# Altium footprint library ACTION_Connector.PcbLib: 138 footprints (part 8 of 9)
Each footprint in its own frame and in the unit in brackets; x right, y up, seen from the top. Pads: shape width x height; smd on the part's side, far side on the other; paste and mask are expansions set on the pad; w line width, h text height; cw(c..) or ccw(c..) is an arc to the next point about the centre after c.
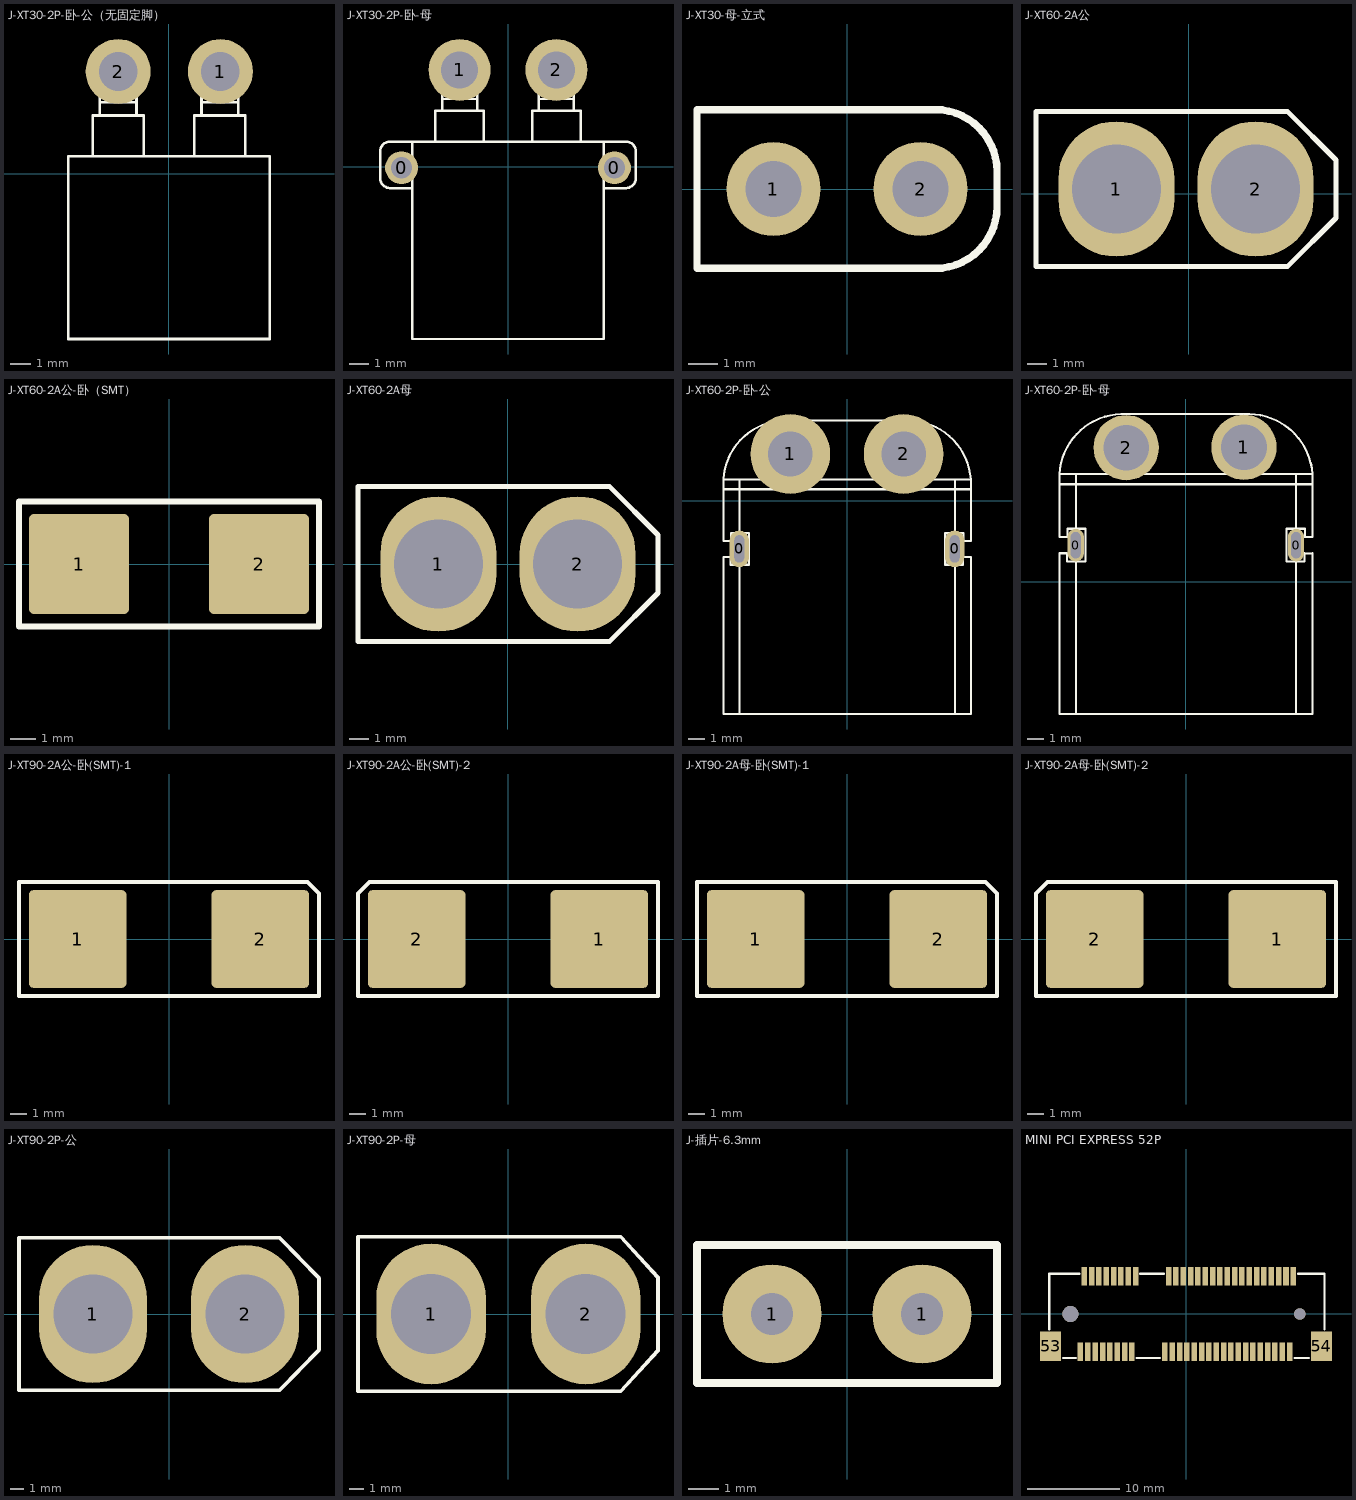
[diagram p7: the footprints below, top view; thin cyan lines are the x and y axes]

## J-XT30-2P-卧-公（无固定脚） [mm]
pads (2):
  round 3.2 hole 1.9: 1(2.54,5.042) 2(-2.489,5.042)
Top Overlay:
  circle w0.127: c2.513,4.937 r0.5
  circle w0.127: c2.513,4.937 r0.8
  circle w0.127: c-2.487,4.937 r0.5
  circle w0.127: c-2.487,4.937 r0.8
  lines w0.127: -3.738,0.877 -3.738,2.877 -1.238,2.877 -1.238,0.877 ; -3.388,2.877 -3.388,3.527 ; -1.588,2.877 -1.588,3.527 ; 1.262,0.877 1.262,2.877 3.762,2.877 3.762,0.877 ; 1.612,4.927 cw(c2.512,4.927) 3.412,4.927 3.412,3.527 ; 1.612,2.877 1.612,3.527 ; 1.612,4.927 1.612,3.527 ; 3.412,2.877 3.412,3.527 ; -3.388,3.527 -1.588,3.527 ; -3.388,3.527 -3.388,4.927 cw(c-2.488,4.927) -1.588,4.927 -1.588,3.527 ; 1.612,3.527 3.412,3.527 ; -4.938,-8.123 -4.938,0.877 -4.038,0.877 4.062,0.877 4.962,0.877 4.962,-8.123 4.062,-8.123 -4.038,-8.123 -4.938,-8.123
3D body "XT30PW-M 3D DRAWING 214.STEP": height 5.35, standoff -1.85, extent -6.645,-8.169 6.655,5.781

## J-XT30-2P-卧-母 [mm]
pads (4):
  round 1.7 hole 1.1: 0(-5.5,-0.05) 0(5.5,-0.05)
  round 3.2 hole 1.9: 1(-2.5,5) 2(2.5,5)
Top Overlay:
  circle w0.127: c-5.513,-0.05 r0.55
  circle w0.127: c5.487,-0.05 r0.5
  circle w0.127: c2.488,4.937 r0.5
  circle w0.127: c2.488,4.937 r0.8
  circle w0.127: c-2.512,4.937 r0.5
  circle w0.127: c-2.512,4.937 r0.8
  lines w0.127: -4.95,-1.1 -6.1,-1.1 cw(c-6.1,-0.6) -6.6,-0.6 -6.6,0.8 cw(c-6.1,0.8) -6.1,1.3 -4.95,1.3 ; -3.75,1.3 -3.75,2.9 -1.25,2.9 -1.25,1.3 ; -3.413,4.927 cw(c-2.513,4.927) -1.613,4.927 ; -3.4,2.9 -3.4,3.5 ; -3.4,4.9 -3.4,3.5 ; -1.6,2.9 -1.6,3.5 ; -1.6,4.9 -1.6,3.5 ; 1.25,1.3 1.25,2.9 3.75,2.9 3.75,1.3 ; 1.587,4.927 cw(c2.487,4.927) 3.387,4.927 ; 1.6,2.9 1.6,3.5 3.4,3.5 ; 1.6,3.527 1.6,4.927 ; 3.4,2.9 3.4,3.5 ; 3.4,4.9 3.4,3.5 ; 4.95,-1.1 6.1,-1.1 ccw(c6.1,-0.6) 6.6,-0.6 6.6,0.8 ccw(c6.1,0.8) 6.1,1.3 4.95,1.3 ; -4.95,1.3 4.95,1.3 ; -4.95,1.3 -4.95,-8.9 4.95,-8.9 4.95,1.3 ; -3.4,3.5 -1.6,3.5
3D body "User Library-XT30PW-F.STEP": height 5.1, standoff -1.9, extent -6.65,-8.937 6.65,5.963

## J-XT30-母-立式 [mm]
pads (2):
  round 3.2 hole 1.9: 1(-2.5,0) 2(2.5,0)
Top Overlay:
  lines w0.254: -5.1,-2.7 3,-2.7 ccw(c3,-0.6) 5.1,-0.6 5.1,0.6 ccw(c3,0.6) 3,2.7 -5.1,2.7 -5.1,-2.7
3D body: height 0.25, standoff 0, extent -10.897,7.569 -10.897,7.569
3D body: height 0.25, standoff 0, extent -0.559,3.785 -0.559,3.785
3D body "User Library-XT30UPB-F-1.STEP": height 9.4, standoff -2, extent -5.1,-2.6 5.1,2.6

## J-XT60-2A公 [mm]
pads (2):
  oval 6x7 hole 4.6: 1(-3.752,0.254) 2(3.448,0.254)
Top Overlay:
  lines w0.254: -7.902,4.253 -7.902,-3.759 5.105,-3.759 ; -7.902,4.267 5.105,4.267 5.105,4.246 7.598,1.754 ; 5.105,-3.738 7.598,-1.246 ; 7.598,-1.246 7.598,1.754 ; 7.598,-1.246 7.598,1.754
3D body "User Library-XT60UPB Fem Vert.STEP": height 13.64, standoff -1.96, extent -7.802,-3.823 7.54,4.077

## J-XT60-2A公-卧（SMT） [mm]
pads (2):
  rrect10% 4x4 smd: 1(-3.6,0) 2(3.6,0)
Top Overlay:
  lines w0.254: -6,-2.5 6,-2.5 6,2.5 -6,2.5 -6,-2.5
3D body "User Library-XT60UPB Fem Vert.STEP": height 6.15, standoff -1.75, extent -7.65,-16.338 7.692,-0.739

## J-XT60-2A母 [mm]
height 1.75
pads (2):
  oval 6x7 hole 4.6: 1(-3.6,0) 2(3.6,0)
Top Overlay:
  lines w0.254: -7.75,3.999 -7.75,-4.013 5.258,-4.013 ; -7.75,4.013 5.258,4.013 5.258,3.992 7.75,1.5 ; 5.258,-3.992 7.75,-1.5 ; 7.75,-1.5 7.75,1.5 ; 7.75,-1.5 7.75,1.5
3D body "M.step": height 15.1, standoff -1.9, extent -7.95,-4.089 7.95,3.911

## J-XT60-2P-卧-公 [mm]
pads (4):
  oval 1.2x2.3 hole 0.6 slot 1.7 at 90 deg: 0(-6.75,-2.999) 0(6.75,-2.999)
  round 5 hole 2.8: 1(-3.55,2.95) 2(3.55,2.95)
Top Overlay:
  circle w0.127: c-3.605,2.998 r0.961
  circle w0.127: c-3.605,2.998 r1.25
  circle w0.127: c3.595,2.998 r0.961
  circle w0.127: c3.595,2.998 r1.25
  lines w0.127: -7.252,-2.494 -7.252,-1.994 -6.745,-1.994 ; -7.095,0.706 -7.095,0.756 ; -7.055,-2.503 -7.745,-2.503 -7.745,0.706 ; -5.595,0.706 -5.595,0.756 ; 5.605,0.706 5.605,0.756 ; 7.045,-3.503 7.745,-3.503 ; 7.045,-3.498 7.252,-3.498 7.745,-3.498 ; 7.045,-2.503 7.745,-2.503 ; 7.045,-2.498 7.286,-2.498 7.745,-2.498 ; 7.105,0.706 7.105,0.756 ; 7.263,-3.494 7.263,-3.994 6.755,-3.994 ; 7.297,-2.494 7.297,-1.994 6.755,-1.994 ; 7.557,1.356 7.557,1.358 ; 7.755,-3.494 7.755,-13.344 6.755,-13.344 ; 7.755,-2.494 7.755,0.706 ; -7.745,0.706 -6.745,0.706 ; -7.745,0.706 -7.745,0.756 ; -7.745,0.756 -6.745,0.756 ; -7.745,0.756 -7.745,1.356 ; -7.745,1.356 cw(c-3.852,1.136) -3.632,5.029 3.556,5.029 cw(c3.819,1.093) 7.755,1.356 ; -7.745,1.356 -6.745,1.356 ; -6.745,-13.344 6.755,-13.344 ; -6.745,-13.344 -6.745,-3.994 ; -6.745,-13.344 -7.745,-13.344 -7.745,-3.494 -7.286,-3.494 -7.286,-3.994 -6.745,-3.994 ; -6.745,-3.994 -6.145,-3.994 -6.145,-1.994 -6.745,-1.994 ; -6.745,-1.994 -6.745,0.706 ; -6.745,0.706 6.755,0.706 ; -6.745,0.756 -6.745,1.356 ; -6.745,0.756 6.755,0.756 ; -6.745,1.356 6.755,1.356 ; 6.755,-13.344 6.755,-3.994 ; 6.755,-3.994 6.155,-3.994 6.155,-1.994 6.755,-1.994 ; 6.755,-1.994 6.755,0.706 ; 6.755,0.706 7.755,0.706 ; 6.755,0.756 6.755,1.356 ; 6.755,0.756 7.755,0.756 ; 6.755,1.356 7.755,1.356 ; 7.755,0.706 7.755,0.756 ; 7.755,0.756 7.755,1.356
3D body "XT60PW-M 3D DRAWING.STEP": height 8.7, standoff -1.8, extent -7.95,-13.366 7.95,4.934

## J-XT60-2P-卧-母 [mm]
pads (4):
  oval 1x2 hole 0.6 slot 1.6 at 90 deg: 0(-6.75,2.234) 0(6.75,2.234)
  round 4 hole 2.8: 1(3.556,8.231) 2(-3.658,8.206)
Top Overlay:
  circle w0.127: c3.595,8.23 r1.25
  circle w0.127: c3.595,8.23 r0.961
  circle w0.127: c-3.605,8.23 r1.25
  circle w0.127: c-3.605,8.23 r0.961
  lines w0.127: -7.252,2.738 -7.252,3.238 -6.745,3.238 ; -7.095,5.938 -7.095,5.988 ; -7.055,2.729 -7.745,2.729 -7.745,5.938 ; -5.595,5.938 -5.595,5.988 ; 5.605,5.938 5.605,5.988 ; 7.045,1.729 7.745,1.729 ; 7.045,1.735 7.252,1.735 7.745,1.735 ; 7.045,2.729 7.745,2.729 ; 7.045,2.735 7.286,2.735 7.745,2.735 ; 7.105,5.938 7.105,5.988 ; 7.263,1.738 7.263,1.238 6.755,1.238 ; 7.297,2.738 7.297,3.238 6.755,3.238 ; 7.557,6.589 7.557,6.59 ; 7.755,1.738 7.755,-8.112 6.755,-8.112 ; 7.755,2.738 7.755,5.938 ; -7.745,5.938 -7.745,5.988 ; -7.745,5.938 -6.745,5.938 ; -7.745,5.988 -7.745,6.588 ; -7.745,5.988 -6.745,5.988 ; -7.745,6.588 cw(c-3.852,6.369) -3.632,10.262 3.556,10.262 cw(c3.819,6.325) 7.755,6.588 ; -7.745,6.588 -6.745,6.588 ; -6.745,-8.112 -7.745,-8.112 -7.745,1.738 -7.286,1.738 -7.286,1.238 -6.745,1.238 ; -6.745,-8.112 -6.745,1.238 ; -6.745,-8.112 6.755,-8.112 ; -6.745,1.238 -6.145,1.238 -6.145,3.238 -6.745,3.238 ; -6.745,3.238 -6.745,5.938 ; -6.745,5.938 6.755,5.938 ; -6.745,5.988 6.755,5.988 ; -6.745,5.988 -6.745,6.588 ; -6.745,6.588 6.755,6.588 ; 6.755,-8.112 6.755,1.238 ; 6.755,1.238 6.155,1.238 6.155,3.238 6.755,3.238 ; 6.755,3.238 6.755,5.938 ; 6.755,5.938 7.755,5.938 ; 6.755,5.988 7.755,5.988 ; 6.755,5.988 6.755,6.588 ; 6.755,6.588 7.755,6.588 ; 7.755,5.938 7.755,5.988 ; 7.755,5.988 7.755,6.588
3D body "User Library-XT60PW-F.step": height 8.4, standoff -2.5, extent -7.651,-7.152 7.849,10.048

## J-XT90-2A公-卧(SMT)-1 [mm]
pads (2):
  rrect10% 6x6 smd: 1(-5.6,0) 2(5.6,0)
Top Overlay:
  lines w0.254: -9.2,-3.5 -9.2,3.5 8.5,3.5 9.2,2.8 9.2,-3.5 -9.2,-3.5
3D body "User Library-XT90PB-M.step": height 8.4, standoff -2.4, extent -10.7,-24.95 10.7,1.45

## J-XT90-2A公-卧(SMT)-2 [mm]
pads (2):
  rrect10% 6x6 smd: 1(5.6,0) 2(-5.6,0)
Top Overlay:
  lines w0.254: -9.2,-3.5 -9.2,2.8 -8.5,3.5 9.2,3.5 9.2,-3.5 -9.2,-3.5
3D body "User Library-XT90PB-M.step": height 8.4, standoff -2.4, extent -10.7,-24.95 10.7,1.45

## J-XT90-2A母-卧(SMT)-1 [mm]
pads (2):
  rrect10% 6x6 smd: 1(-5.6,0) 2(5.6,0)
Top Overlay:
  lines w0.254: -9.2,-3.5 9.2,-3.5 9.2,2.8 8.5,3.5 -9.2,3.5 -9.2,-3.5
3D body "xt90_female.stp": height 8.47, standoff -2.47, extent -10.51,-25.5 10.51,0.83

## J-XT90-2A母-卧(SMT)-2 [mm]
pads (2):
  rrect10% 6x6 smd: 1(5.6,0) 2(-5.6,0)
Top Overlay:
  lines w0.254: -9.2,-3.5 -9.2,2.8 -8.5,3.5 9.2,3.5 9.2,-3.5 -9.2,-3.5
3D body "xt90_female.stp": height 8.47, standoff -2.47, extent -10.51,-25.5 10.51,0.83

## J-XT90-2P-公 [mm]
pads (2):
  oval 7.8x10 hole 5.7: 1(-5.5,0) 2(5.5,0)
Top Overlay:
  lines w0.254: -10.85,-5.5 8,-5.5 10.85,-2.6 10.85,2.6 8,5.5 -10.85,5.5 -10.85,-5.5
3D body "xt90_male_asm.stp": height 20.7, standoff -5.5, extent -10.7,-5.5 10.7,5.5

## J-XT90-2P-母 [mm]
pads (2):
  oval 7.8x10 hole 5.7: 1(-5.5,0) 2(5.5,0)
Top Overlay:
  lines w0.254: -10.7,-5.5 -10.7,5.5 8,5.5 10.65,2.6 10.65,-2.6 8,-5.5 -10.7,-5.5
3D body "xt90_female.stp": height 21.5, standoff -4.83, extent -10.51,-5.47 10.51,5.47

## J-插片-6.3mm [mm]
pads (2):
  round 3.3 hole 1.4: 1(-2.5,0) 1(2.5,0)
Top Overlay:
  lines w0.254: -5,-2.3 -5,2.3 5,2.3 5,-2.3 -4.966,-2.3
3D body "User Library-DJ610 6_3 (TA-M).step": height 10, standoff -3.5, extent -4,-0.4 4,0.4

## MINI PCI EXPRESS 52P [mm]
pads (56):
  rect 0.6x2 smd: 1(-11.5,-4.1) 2(-11.1,4.1) 3(-10.7,-4.1) 4(-10.3,4.1) 5(-9.9,-4.1) 6(-9.498,4.1) 7(-9.1,-4.1) 8(-8.7,4.1) 9(-8.3,-4.1) 10(-7.9,4.1) 11(-7.5,-4.1) 12(-7.1,4.1) 13(-6.7,-4.1) 14(-6.3,4.1) 15(-5.9,-4.1) 16(-5.5,4.1) 17(-2.3,-4.1) 18(-1.9,4.1) 19(-1.5,-4.1) 20(-1.1,4.1) 21(-0.7,-4.1) 22(-0.3,4.1) 23(0.1,-4.1) 24(0.5,4.1) 25(0.9,-4.1) 26(1.3,4.1) 27(1.7,-4.1) 28(2.1,4.1) 29(2.5,-4.1) 30(2.9,4.1) 31(3.3,-4.1) 32(3.7,4.1) 33(4.1,-4.1) 34(4.5,4.1) 35(4.9,-4.1) 36(5.3,4.1) 37(5.7,-4.1) 38(6.1,4.1) 39(6.502,-4.1) 40(6.9,4.1) 41(7.3,-4.1) 42(7.7,4.1) 43(8.1,-4.1) 44(8.5,4.1) 45(8.9,-4.1) 46(9.302,4.1) 47(9.7,-4.1) 48(10.1,4.1) 49(10.5,-4.1) 50(10.9,4.1) 51(11.3,-4.1) 52(11.7,4.1)
  rect 2.3x3.2 smd: 53(-14.75,-3.5) 54(14.75,-3.5)
  round 1.75 hole 1.75 unplated: ""(-12.6,0)
  round 1.25 hole 1.25 unplated: ""(12.4,0)
Top Overlay:
  lines w0.254: -14.9,-1.669 -14.9,4.4 -11.631,4.4 ; -13.369,-4.8 -12.031,-4.8 ; -5.369,-4.8 -2.831,-4.8 ; -4.969,4.4 -2.431,4.4 ; 11.831,-4.8 13.369,-4.8 ; 12.231,4.4 15.1,4.4 15.1,-1.669